# Altium footprint library Connectors.PcbLib: 268 footprints (part 13 of 21)
Each footprint in its own frame and in the unit in brackets; x right, y up, seen from the top. Pads: shape width x height; smd on the part's side, far side on the other; paste and mask are expansions set on the pad; w line width, h text height; cw(c..) or ccw(c..) is an arc to the next point about the centre after c.
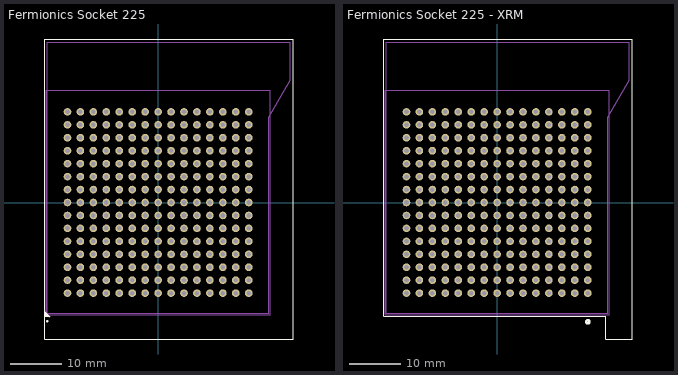
[diagram p12: the footprints below, top view; thin cyan lines are the x and y axes]

## Fermionics Socket 225 [mm] "Fermionics Socket 225"
height 8.636
pads (225):
  round 1.5 hole 0.9: A1(-17.78,-17.78) A2(-15.24,-17.78) A3(-12.7,-17.78) A4(-10.16,-17.78) A5(-7.62,-17.78) A6(-5.08,-17.78) A7(-2.54,-17.78) A8(0,-17.78) A9(2.54,-17.78) A10(5.08,-17.78) A11(7.62,-17.78) A12(10.16,-17.78) A13(12.7,-17.78) A14(15.24,-17.78) A15(17.78,-17.78) B1(-17.78,-15.24) B2(-15.24,-15.24) B3(-12.7,-15.24) B4(-10.16,-15.24) B5(-7.62,-15.24) B6(-5.08,-15.24) B7(-2.54,-15.24) B8(0,-15.24) B9(2.54,-15.24) B10(5.08,-15.24) B11(7.62,-15.24) B12(10.16,-15.24) B13(12.7,-15.24) B14(15.24,-15.24) B15(17.78,-15.24) C1(-17.78,-12.7) C2(-15.24,-12.7) C3(-12.7,-12.7) C4(-10.16,-12.7) C5(-7.62,-12.7) C6(-5.08,-12.7) C7(-2.54,-12.7) C8(0,-12.7) C9(2.54,-12.7) C10(5.08,-12.7) C11(7.62,-12.7) C12(10.16,-12.7) C13(12.7,-12.7) C14(15.24,-12.7) C15(17.78,-12.7) D1(-17.78,-10.16) D2(-15.24,-10.16) D3(-12.7,-10.16) D4(-10.16,-10.16) D5(-7.62,-10.16) D6(-5.08,-10.16) D7(-2.54,-10.16) D8(0,-10.16) D9(2.54,-10.16) D10(5.08,-10.16) D11(7.62,-10.16) D12(10.16,-10.16) D13(12.7,-10.16) D14(15.24,-10.16) D15(17.78,-10.16) E1(-17.78,-7.62) E2(-15.24,-7.62) E3(-12.7,-7.62) E4(-10.16,-7.62) E5(-7.62,-7.62) E6(-5.08,-7.62) E7(-2.54,-7.62) E8(0,-7.62) E9(2.54,-7.62) E10(5.08,-7.62) E11(7.62,-7.62) E12(10.16,-7.62) E13(12.7,-7.62) E14(15.24,-7.62) E15(17.78,-7.62) F1(-17.78,-5.08) F2(-15.24,-5.08) F3(-12.7,-5.08) F4(-10.16,-5.08) F5(-7.62,-5.08) F6(-5.08,-5.08) F7(-2.54,-5.08) F8(0,-5.08) F9(2.54,-5.08) F10(5.08,-5.08) F11(7.62,-5.08) F12(10.16,-5.08) F13(12.7,-5.08) F14(15.24,-5.08) F15(17.78,-5.08) G1(-17.78,-2.54) G2(-15.24,-2.54) G3(-12.7,-2.54) G4(-10.16,-2.54) G5(-7.62,-2.54) G6(-5.08,-2.54) G7(-2.54,-2.54) G8(0,-2.54) G9(2.54,-2.54) G10(5.08,-2.54) G11(7.62,-2.54) G12(10.16,-2.54) G13(12.7,-2.54) G14(15.24,-2.54) G15(17.78,-2.54) H1(-17.78,0) H2(-15.24,0) H3(-12.7,0) H4(-10.16,0) H5(-7.62,0) H6(-5.08,0) H7(-2.54,0) H8(0,0) H9(2.54,0) H10(5.08,0) H11(7.62,0) H12(10.16,0) H13(12.7,0) H14(15.24,0) H15(17.78,0) J1(-17.78,2.54) J2(-15.24,2.54) J3(-12.7,2.54) J4(-10.16,2.54) J5(-7.62,2.54) J6(-5.08,2.54) J7(-2.54,2.54) J8(0,2.54) J9(2.54,2.54) J10(5.08,2.54) J11(7.62,2.54) J12(10.16,2.54) J13(12.7,2.54) J14(15.24,2.54) J15(17.78,2.54) K1(-17.78,5.08) K2(-15.24,5.08) K3(-12.7,5.08) K4(-10.16,5.08) K5(-7.62,5.08) K6(-5.08,5.08) K7(-2.54,5.08) K8(0,5.08) K9(2.54,5.08) K10(5.08,5.08) K11(7.62,5.08) K12(10.16,5.08) K13(12.7,5.08) K14(15.24,5.08) K15(17.78,5.08) L1(-17.78,7.62) L2(-15.24,7.62) L3(-12.7,7.62) L4(-10.16,7.62) L5(-7.62,7.62) L6(-5.08,7.62) L7(-2.54,7.62) L8(0,7.62) L9(2.54,7.62) L10(5.08,7.62) L11(7.62,7.62) L12(10.16,7.62) L13(12.7,7.62) L14(15.24,7.62) L15(17.78,7.62) M1(-17.78,10.16) M2(-15.24,10.16) M3(-12.7,10.16) M4(-10.16,10.16) M5(-7.62,10.16) M6(-5.08,10.16) M7(-2.54,10.16) M8(0,10.16) M9(2.54,10.16) M10(5.08,10.16) M11(7.62,10.16) M12(10.16,10.16) M13(12.7,10.16) M14(15.24,10.16) M15(17.78,10.16) N1(-17.78,12.7) N2(-15.24,12.7) N3(-12.7,12.7) N4(-10.16,12.7) N5(-7.62,12.7) N6(-5.08,12.7) N7(-2.54,12.7) N8(0,12.7) N9(2.54,12.7) N10(5.08,12.7) N11(7.62,12.7) N12(10.16,12.7) N13(12.7,12.7) N14(15.24,12.7) N15(17.78,12.7) P1(-17.78,15.24) P2(-15.24,15.24) P3(-12.7,15.24) P4(-10.16,15.24) P5(-7.62,15.24) P6(-5.08,15.24) P7(-2.54,15.24) P8(0,15.24) P9(2.54,15.24) P10(5.08,15.24) P11(7.62,15.24) P12(10.16,15.24) P13(12.7,15.24) P14(15.24,15.24) P15(17.78,15.24) R1(-17.78,17.78) R2(-15.24,17.78) R3(-12.7,17.78) R4(-10.16,17.78) R5(-7.62,17.78) R6(-5.08,17.78) R7(-2.54,17.78) R8(0,17.78) R9(2.54,17.78) R10(5.08,17.78) R11(7.62,17.78) R12(10.16,17.78) R13(12.7,17.78) R14(15.24,17.78) R15(17.78,17.78)
Top Overlay:
  circle w0.25: c-21.725,-23.275 r0.125
  region: -22.275,-21.45 -21.275,-22.45 -22.275,-22.45
  lines w0.2: -22.275,-21.45 -21.275,-22.45 ; -22.275,-26.775 -22.275,32.075 26.55,32.075 26.55,-26.775 -22.275,-26.775
Mechanical 13:
  lines w0.1: -21.715,-21.715 -21.715,31.485 25.912,31.485 25.912,23.995 21.715,16.755 21.715,-21.715 -21.715,-21.715
Mechanical 15:
  lines w0.05: -21.975,-21.975 -21.975,21.975 21.975,21.975 21.975,-21.975 -21.975,-21.975
3D body: height 8.64, standoff 4, extent 21.975,-26.795 25.726,23.675
3D body: height 8.64, standoff 0, extent -21.715,-21.715 25.912,31.485
3D body: height 0, standoff -3.23, extent -18.075,17.5 -17.5,18.075
3D body: height 0, standoff -3.23, extent -15.535,17.5 -14.96,18.075
3D body: height 0, standoff -3.23, extent -12.995,17.5 -12.42,18.075
3D body: height 0, standoff -3.23, extent -10.455,17.5 -9.88,18.075
3D body: height 0, standoff -3.23, extent -7.915,17.5 -7.34,18.075
3D body: height 0, standoff -3.23, extent -5.375,17.5 -4.8,18.075
3D body: height 0, standoff -3.23, extent -2.835,17.5 -2.26,18.075
3D body: height 0, standoff -3.23, extent -0.295,17.5 0.28,18.075
3D body: height 0, standoff -3.23, extent 2.245,17.5 2.82,18.075
3D body: height 0, standoff -3.23, extent 4.785,17.5 5.36,18.075
3D body: height 0, standoff -3.23, extent 7.325,17.5 7.9,18.075
3D body: height 0, standoff -3.23, extent 9.865,17.5 10.44,18.075
3D body: height 0, standoff -3.23, extent 12.405,17.5 12.98,18.075
3D body: height 0, standoff -3.23, extent 14.945,17.5 15.52,18.075
3D body: height 0, standoff -3.23, extent 17.485,17.5 18.06,18.075
3D body: height 0, standoff -3.23, extent 17.485,14.96 18.06,15.535
3D body: height 0, standoff -3.23, extent 14.945,14.96 15.52,15.535
3D body: height 0, standoff -3.23, extent 12.405,14.96 12.98,15.535
3D body: height 0, standoff -3.23, extent 9.865,14.96 10.44,15.535
3D body: height 0, standoff -3.23, extent 7.325,14.96 7.9,15.535
3D body: height 0, standoff -3.23, extent 4.785,14.96 5.36,15.535
3D body: height 0, standoff -3.23, extent 2.245,14.96 2.82,15.535
3D body: height 0, standoff -3.23, extent -0.295,14.96 0.28,15.535
3D body: height 0, standoff -3.23, extent -2.835,14.96 -2.26,15.535
3D body: height 0, standoff -3.23, extent -5.375,14.96 -4.8,15.535
3D body: height 0, standoff -3.23, extent -7.915,14.96 -7.34,15.535
3D body: height 0, standoff -3.23, extent -10.455,14.96 -9.88,15.535
3D body: height 0, standoff -3.23, extent -12.995,14.96 -12.42,15.535
3D body: height 0, standoff -3.23, extent -15.535,14.96 -14.96,15.535
3D body: height 0, standoff -3.23, extent -18.075,14.96 -17.5,15.535
3D body: height 0, standoff -3.23, extent 17.485,12.42 18.06,12.995
3D body: height 0, standoff -3.23, extent 14.945,12.42 15.52,12.995
3D body: height 0, standoff -3.23, extent 12.405,12.42 12.98,12.995
3D body: height 0, standoff -3.23, extent 9.865,12.42 10.44,12.995
3D body: height 0, standoff -3.23, extent 7.325,12.42 7.9,12.995
3D body: height 0, standoff -3.23, extent 4.785,12.42 5.36,12.995
3D body: height 0, standoff -3.23, extent 2.245,12.42 2.82,12.995
3D body: height 0, standoff -3.23, extent -0.295,12.42 0.28,12.995
3D body: height 0, standoff -3.23, extent -2.835,12.42 -2.26,12.995
3D body: height 0, standoff -3.23, extent -5.375,12.42 -4.8,12.995
3D body: height 0, standoff -3.23, extent -7.915,12.42 -7.34,12.995
3D body: height 0, standoff -3.23, extent -10.455,12.42 -9.88,12.995
3D body: height 0, standoff -3.23, extent -12.995,12.42 -12.42,12.995
3D body: height 0, standoff -3.23, extent -15.535,12.42 -14.96,12.995
3D body: height 0, standoff -3.23, extent -18.075,12.42 -17.5,12.995
3D body: height 0, standoff -3.23, extent 17.485,9.88 18.06,10.455
3D body: height 0, standoff -3.23, extent 14.945,9.88 15.52,10.455
3D body: height 0, standoff -3.23, extent 12.405,9.88 12.98,10.455
3D body: height 0, standoff -3.23, extent 9.865,9.88 10.44,10.455
3D body: height 0, standoff -3.23, extent 7.325,9.88 7.9,10.455
3D body: height 0, standoff -3.23, extent 4.785,9.88 5.36,10.455
3D body: height 0, standoff -3.23, extent 2.245,9.88 2.82,10.455
3D body: height 0, standoff -3.23, extent -0.295,9.88 0.28,10.455
3D body: height 0, standoff -3.23, extent -2.835,9.88 -2.26,10.455
3D body: height 0, standoff -3.23, extent -5.375,9.88 -4.8,10.455
3D body: height 0, standoff -3.23, extent -7.915,9.88 -7.34,10.455
3D body: height 0, standoff -3.23, extent -10.455,9.88 -9.88,10.455
3D body: height 0, standoff -3.23, extent -12.995,9.88 -12.42,10.455
3D body: height 0, standoff -3.23, extent -15.535,9.88 -14.96,10.455
3D body: height 0, standoff -3.23, extent -18.075,9.88 -17.5,10.455
3D body: height 0, standoff -3.23, extent 17.485,7.34 18.06,7.915
3D body: height 0, standoff -3.23, extent 14.945,7.34 15.52,7.915
3D body: height 0, standoff -3.23, extent 12.405,7.34 12.98,7.915
3D body: height 0, standoff -3.23, extent 9.865,7.34 10.44,7.915
3D body: height 0, standoff -3.23, extent 7.325,7.34 7.9,7.915
3D body: height 0, standoff -3.23, extent 4.785,7.34 5.36,7.915
3D body: height 0, standoff -3.23, extent 2.245,7.34 2.82,7.915
3D body: height 0, standoff -3.23, extent -0.295,7.34 0.28,7.915
3D body: height 0, standoff -3.23, extent -2.835,7.34 -2.26,7.915
3D body: height 0, standoff -3.23, extent -5.375,7.34 -4.8,7.915
3D body: height 0, standoff -3.23, extent -7.915,7.34 -7.34,7.915
3D body: height 0, standoff -3.23, extent -10.455,7.34 -9.88,7.915
3D body: height 0, standoff -3.23, extent -12.995,7.34 -12.42,7.915
3D body: height 0, standoff -3.23, extent -15.535,7.34 -14.96,7.915
3D body: height 0, standoff -3.23, extent -18.075,7.34 -17.5,7.915
3D body: height 0, standoff -3.23, extent 17.485,4.8 18.06,5.375
3D body: height 0, standoff -3.23, extent 14.945,4.8 15.52,5.375
3D body: height 0, standoff -3.23, extent 12.405,4.8 12.98,5.375
3D body: height 0, standoff -3.23, extent 9.865,4.8 10.44,5.375
3D body: height 0, standoff -3.23, extent 7.325,4.8 7.9,5.375
3D body: height 0, standoff -3.23, extent 4.785,4.8 5.36,5.375
3D body: height 0, standoff -3.23, extent 2.245,4.8 2.82,5.375
3D body: height 0, standoff -3.23, extent -0.295,4.8 0.28,5.375
3D body: height 0, standoff -3.23, extent -2.835,4.8 -2.26,5.375
3D body: height 0, standoff -3.23, extent -5.375,4.8 -4.8,5.375
3D body: height 0, standoff -3.23, extent -7.915,4.8 -7.34,5.375
3D body: height 0, standoff -3.23, extent -10.455,4.8 -9.88,5.375
3D body: height 0, standoff -3.23, extent -12.995,4.8 -12.42,5.375
3D body: height 0, standoff -3.23, extent -15.535,4.8 -14.96,5.375
3D body: height 0, standoff -3.23, extent -18.075,4.8 -17.5,5.375
3D body: height 0, standoff -3.23, extent 17.485,2.26 18.06,2.835
3D body: height 0, standoff -3.23, extent 14.945,2.26 15.52,2.835
3D body: height 0, standoff -3.23, extent 12.405,2.26 12.98,2.835
3D body: height 0, standoff -3.23, extent 9.865,2.26 10.44,2.835
3D body: height 0, standoff -3.23, extent 7.325,2.26 7.9,2.835
3D body: height 0, standoff -3.23, extent 4.785,2.26 5.36,2.835
3D body: height 0, standoff -3.23, extent 2.245,2.26 2.82,2.835
3D body: height 0, standoff -3.23, extent -0.295,2.26 0.28,2.835
3D body: height 0, standoff -3.23, extent -2.835,2.26 -2.26,2.835
3D body: height 0, standoff -3.23, extent -5.375,2.26 -4.8,2.835
3D body: height 0, standoff -3.23, extent -7.915,2.26 -7.34,2.835
3D body: height 0, standoff -3.23, extent -10.455,2.26 -9.88,2.835
3D body: height 0, standoff -3.23, extent -12.995,2.26 -12.42,2.835
3D body: height 0, standoff -3.23, extent -15.535,2.26 -14.96,2.835
3D body: height 0, standoff -3.23, extent -18.075,2.26 -17.5,2.835
3D body: height 0, standoff -3.23, extent 17.485,-0.28 18.06,0.295
3D body: height 0, standoff -3.23, extent 14.945,-0.28 15.52,0.295
3D body: height 0, standoff -3.23, extent 12.405,-0.28 12.98,0.295
3D body: height 0, standoff -3.23, extent 9.865,-0.28 10.44,0.295
3D body: height 0, standoff -3.23, extent 7.325,-0.28 7.9,0.295
3D body: height 0, standoff -3.23, extent 4.785,-0.28 5.36,0.295
3D body: height 0, standoff -3.23, extent 2.245,-0.28 2.82,0.295
3D body: height 0, standoff -3.23, extent -0.295,-0.28 0.28,0.295
3D body: height 0, standoff -3.23, extent -2.835,-0.28 -2.26,0.295
3D body: height 0, standoff -3.23, extent -5.375,-0.28 -4.8,0.295
3D body: height 0, standoff -3.23, extent -7.915,-0.28 -7.34,0.295
3D body: height 0, standoff -3.23, extent -10.455,-0.28 -9.88,0.295
3D body: height 0, standoff -3.23, extent -12.995,-0.28 -12.42,0.295
3D body: height 0, standoff -3.23, extent -15.535,-0.28 -14.96,0.295
3D body: height 0, standoff -3.23, extent -18.075,-0.28 -17.5,0.295
3D body: height 0, standoff -3.23, extent 17.485,-2.82 18.06,-2.245
3D body: height 0, standoff -3.23, extent 14.945,-2.82 15.52,-2.245
3D body: height 0, standoff -3.23, extent 12.405,-2.82 12.98,-2.245
3D body: height 0, standoff -3.23, extent 9.865,-2.82 10.44,-2.245
3D body: height 0, standoff -3.23, extent 7.325,-2.82 7.9,-2.245
3D body: height 0, standoff -3.23, extent 4.785,-2.82 5.36,-2.245
3D body: height 0, standoff -3.23, extent 2.245,-2.82 2.82,-2.245
3D body: height 0, standoff -3.23, extent -0.295,-2.82 0.28,-2.245
3D body: height 0, standoff -3.23, extent -2.835,-2.82 -2.26,-2.245
3D body: height 0, standoff -3.23, extent -5.375,-2.82 -4.8,-2.245
3D body: height 0, standoff -3.23, extent -7.915,-2.82 -7.34,-2.245
3D body: height 0, standoff -3.23, extent -10.455,-2.82 -9.88,-2.245
3D body: height 0, standoff -3.23, extent -12.995,-2.82 -12.42,-2.245
3D body: height 0, standoff -3.23, extent -15.535,-2.82 -14.96,-2.245
3D body: height 0, standoff -3.23, extent -18.075,-2.82 -17.5,-2.245
3D body: height 0, standoff -3.23, extent 17.485,-5.36 18.06,-4.785
3D body: height 0, standoff -3.23, extent 14.945,-5.36 15.52,-4.785
3D body: height 0, standoff -3.23, extent 12.405,-5.36 12.98,-4.785
3D body: height 0, standoff -3.23, extent 9.865,-5.36 10.44,-4.785
3D body: height 0, standoff -3.23, extent 7.325,-5.36 7.9,-4.785
3D body: height 0, standoff -3.23, extent 4.785,-5.36 5.36,-4.785
3D body: height 0, standoff -3.23, extent 2.245,-5.36 2.82,-4.785
3D body: height 0, standoff -3.23, extent -0.295,-5.36 0.28,-4.785
3D body: height 0, standoff -3.23, extent -2.835,-5.36 -2.26,-4.785
3D body: height 0, standoff -3.23, extent -5.375,-5.36 -4.8,-4.785
3D body: height 0, standoff -3.23, extent -7.915,-5.36 -7.34,-4.785
3D body: height 0, standoff -3.23, extent -10.455,-5.36 -9.88,-4.785
3D body: height 0, standoff -3.23, extent -12.995,-5.36 -12.42,-4.785
3D body: height 0, standoff -3.23, extent -15.535,-5.36 -14.96,-4.785
3D body: height 0, standoff -3.23, extent -18.075,-5.36 -17.5,-4.785
3D body: height 0, standoff -3.23, extent 17.485,-7.9 18.06,-7.325
3D body: height 0, standoff -3.23, extent 14.945,-7.9 15.52,-7.325
3D body: height 0, standoff -3.23, extent 12.405,-7.9 12.98,-7.325
3D body: height 0, standoff -3.23, extent 9.865,-7.9 10.44,-7.325
3D body: height 0, standoff -3.23, extent 7.325,-7.9 7.9,-7.325
3D body: height 0, standoff -3.23, extent 4.785,-7.9 5.36,-7.325
3D body: height 0, standoff -3.23, extent 2.245,-7.9 2.82,-7.325
3D body: height 0, standoff -3.23, extent -0.295,-7.9 0.28,-7.325
3D body: height 0, standoff -3.23, extent -2.835,-7.9 -2.26,-7.325
3D body: height 0, standoff -3.23, extent -5.375,-7.9 -4.8,-7.325
3D body: height 0, standoff -3.23, extent -7.915,-7.9 -7.34,-7.325
3D body: height 0, standoff -3.23, extent -10.455,-7.9 -9.88,-7.325
3D body: height 0, standoff -3.23, extent -12.995,-7.9 -12.42,-7.325
3D body: height 0, standoff -3.23, extent -15.535,-7.9 -14.96,-7.325
3D body: height 0, standoff -3.23, extent -18.075,-7.9 -17.5,-7.325
3D body: height 0, standoff -3.23, extent 17.485,-10.44 18.06,-9.865
3D body: height 0, standoff -3.23, extent 14.945,-10.44 15.52,-9.865
3D body: height 0, standoff -3.23, extent 12.405,-10.44 12.98,-9.865
3D body: height 0, standoff -3.23, extent 9.865,-10.44 10.44,-9.865
3D body: height 0, standoff -3.23, extent 7.325,-10.44 7.9,-9.865
3D body: height 0, standoff -3.23, extent 4.785,-10.44 5.36,-9.865
3D body: height 0, standoff -3.23, extent 2.245,-10.44 2.82,-9.865
3D body: height 0, standoff -3.23, extent -0.295,-10.44 0.28,-9.865
3D body: height 0, standoff -3.23, extent -2.835,-10.44 -2.26,-9.865
3D body: height 0, standoff -3.23, extent -5.375,-10.44 -4.8,-9.865
3D body: height 0, standoff -3.23, extent -7.915,-10.44 -7.34,-9.865
3D body: height 0, standoff -3.23, extent -10.455,-10.44 -9.88,-9.865
3D body: height 0, standoff -3.23, extent -12.995,-10.44 -12.42,-9.865
3D body: height 0, standoff -3.23, extent -15.535,-10.44 -14.96,-9.865
3D body: height 0, standoff -3.23, extent -18.075,-10.44 -17.5,-9.865
3D body: height 0, standoff -3.23, extent 17.485,-12.98 18.06,-12.405
3D body: height 0, standoff -3.23, extent 14.945,-12.98 15.52,-12.405
3D body: height 0, standoff -3.23, extent 12.405,-12.98 12.98,-12.405
3D body: height 0, standoff -3.23, extent 9.865,-12.98 10.44,-12.405
3D body: height 0, standoff -3.23, extent 7.325,-12.98 7.9,-12.405
3D body: height 0, standoff -3.23, extent 4.785,-12.98 5.36,-12.405
3D body: height 0, standoff -3.23, extent 2.245,-12.98 2.82,-12.405
3D body: height 0, standoff -3.23, extent -0.295,-12.98 0.28,-12.405
3D body: height 0, standoff -3.23, extent -2.835,-12.98 -2.26,-12.405
3D body: height 0, standoff -3.23, extent -5.375,-12.98 -4.8,-12.405
3D body: height 0, standoff -3.23, extent -7.915,-12.98 -7.34,-12.405
3D body: height 0, standoff -3.23, extent -10.455,-12.98 -9.88,-12.405
3D body: height 0, standoff -3.23, extent -12.995,-12.98 -12.42,-12.405
3D body: height 0, standoff -3.23, extent -15.535,-12.98 -14.96,-12.405
3D body: height 0, standoff -3.23, extent -18.075,-12.98 -17.5,-12.405
3D body: height 0, standoff -3.23, extent 17.485,-15.52 18.06,-14.945
3D body: height 0, standoff -3.23, extent 14.945,-15.52 15.52,-14.945
3D body: height 0, standoff -3.23, extent 12.405,-15.52 12.98,-14.945
3D body: height 0, standoff -3.23, extent 9.865,-15.52 10.44,-14.945
3D body: height 0, standoff -3.23, extent 7.325,-15.52 7.9,-14.945
3D body: height 0, standoff -3.23, extent 4.785,-15.52 5.36,-14.945
3D body: height 0, standoff -3.23, extent 2.245,-15.52 2.82,-14.945
3D body: height 0, standoff -3.23, extent -0.295,-15.52 0.28,-14.945
3D body: height 0, standoff -3.23, extent -2.835,-15.52 -2.26,-14.945
3D body: height 0, standoff -3.23, extent -5.375,-15.52 -4.8,-14.945
3D body: height 0, standoff -3.23, extent -7.915,-15.52 -7.34,-14.945
3D body: height 0, standoff -3.23, extent -10.455,-15.52 -9.88,-14.945
3D body: height 0, standoff -3.23, extent -12.995,-15.52 -12.42,-14.945
3D body: height 0, standoff -3.23, extent -15.535,-15.52 -14.96,-14.945
3D body: height 0, standoff -3.23, extent -18.075,-15.52 -17.5,-14.945
3D body: height 0, standoff -3.23, extent 17.485,-18.06 18.06,-17.485
3D body: height 0, standoff -3.23, extent 14.945,-18.06 15.52,-17.485
3D body: height 0, standoff -3.23, extent 12.405,-18.06 12.98,-17.485
3D body: height 0, standoff -3.23, extent 9.865,-18.06 10.44,-17.485
3D body: height 0, standoff -3.23, extent 7.325,-18.06 7.9,-17.485
3D body: height 0, standoff -3.23, extent 4.785,-18.06 5.36,-17.485
3D body: height 0, standoff -3.23, extent 2.245,-18.06 2.82,-17.485
3D body: height 0, standoff -3.23, extent -0.295,-18.06 0.28,-17.485
3D body: height 0, standoff -3.23, extent -2.835,-18.06 -2.26,-17.485
3D body: height 0, standoff -3.23, extent -5.375,-18.06 -4.8,-17.485
3D body: height 0, standoff -3.23, extent -7.915,-18.06 -7.34,-17.485
3D body: height 0, standoff -3.23, extent -10.455,-18.06 -9.88,-17.485
3D body: height 0, standoff -3.23, extent -12.995,-18.06 -12.42,-17.485
3D body: height 0, standoff -3.23, extent -15.535,-18.06 -14.96,-17.485
3D body: height 0, standoff -3.23, extent -18.075,-18.06 -17.5,-17.485

## Fermionics Socket 225 - XRM [mm] "Fermionics Socket 225 - Rotated Pinout to match Sensor"
height 8.636
pads (225):
  round 1.5 hole 0.9: A1(17.78,-17.78) A2(15.24,-17.78) A3(12.7,-17.78) A4(10.16,-17.78) A5(7.62,-17.78) A6(5.08,-17.78) A7(2.54,-17.78) A8(0,-17.78) A9(-2.54,-17.78) A10(-5.08,-17.78) A11(-7.62,-17.78) A12(-10.16,-17.78) A13(-12.7,-17.78) A14(-15.24,-17.78) A15(-17.78,-17.78) B1(17.78,-15.24) B2(15.24,-15.24) B3(12.7,-15.24) B4(10.16,-15.24) B5(7.62,-15.24) B6(5.08,-15.24) B7(2.54,-15.24) B8(0,-15.24) B9(-2.54,-15.24) B10(-5.08,-15.24) B11(-7.62,-15.24) B12(-10.16,-15.24) B13(-12.7,-15.24) B14(-15.24,-15.24) B15(-17.78,-15.24) C1(17.78,-12.7) C2(15.24,-12.7) C3(12.7,-12.7) C4(10.16,-12.7) C5(7.62,-12.7) C6(5.08,-12.7) C7(2.54,-12.7) C8(0,-12.7) C9(-2.54,-12.7) C10(-5.08,-12.7) C11(-7.62,-12.7) C12(-10.16,-12.7) C13(-12.7,-12.7) C14(-15.24,-12.7) C15(-17.78,-12.7) D1(17.78,-10.16) D2(15.24,-10.16) D3(12.7,-10.16) D4(10.16,-10.16) D5(7.62,-10.16) D6(5.08,-10.16) D7(2.54,-10.16) D8(0,-10.16) D9(-2.54,-10.16) D10(-5.08,-10.16) D11(-7.62,-10.16) D12(-10.16,-10.16) D13(-12.7,-10.16) D14(-15.24,-10.16) D15(-17.78,-10.16) E1(17.78,-7.62) E2(15.24,-7.62) E3(12.7,-7.62) E4(10.16,-7.62) E5(7.62,-7.62) E6(5.08,-7.62) E7(2.54,-7.62) E8(0,-7.62) E9(-2.54,-7.62) E10(-5.08,-7.62) E11(-7.62,-7.62) E12(-10.16,-7.62) E13(-12.7,-7.62) E14(-15.24,-7.62) E15(-17.78,-7.62) F1(17.78,-5.08) F2(15.24,-5.08) F3(12.7,-5.08) F4(10.16,-5.08) F5(7.62,-5.08) F6(5.08,-5.08) F7(2.54,-5.08) F8(0,-5.08) F9(-2.54,-5.08) F10(-5.08,-5.08) F11(-7.62,-5.08) F12(-10.16,-5.08) F13(-12.7,-5.08) F14(-15.24,-5.08) F15(-17.78,-5.08) G1(17.78,-2.54) G2(15.24,-2.54) G3(12.7,-2.54) G4(10.16,-2.54) G5(7.62,-2.54) G6(5.08,-2.54) G7(2.54,-2.54) G8(0,-2.54) G9(-2.54,-2.54) G10(-5.08,-2.54) G11(-7.62,-2.54) G12(-10.16,-2.54) G13(-12.7,-2.54) G14(-15.24,-2.54) G15(-17.78,-2.54) H1(17.78,0) H2(15.24,0) H3(12.7,0) H4(10.16,0) H5(7.62,0) H6(5.08,0) H7(2.54,0) H8(0,0) H9(-2.54,0) H10(-5.08,0) H11(-7.62,0) H12(-10.16,0) H13(-12.7,0) H14(-15.24,0) H15(-17.78,0) J1(17.78,2.54) J2(15.24,2.54) J3(12.7,2.54) J4(10.16,2.54) J5(7.62,2.54) J6(5.08,2.54) J7(2.54,2.54) J8(0,2.54) J9(-2.54,2.54) J10(-5.08,2.54) J11(-7.62,2.54) J12(-10.16,2.54) J13(-12.7,2.54) J14(-15.24,2.54) J15(-17.78,2.54) K1(17.78,5.08) K2(15.24,5.08) K3(12.7,5.08) K4(10.16,5.08) K5(7.62,5.08) K6(5.08,5.08) K7(2.54,5.08) K8(0,5.08) K9(-2.54,5.08) K10(-5.08,5.08) K11(-7.62,5.08) K12(-10.16,5.08) K13(-12.7,5.08) K14(-15.24,5.08) K15(-17.78,5.08) L1(17.78,7.62) L2(15.24,7.62) L3(12.7,7.62) L4(10.16,7.62) L5(7.62,7.62) L6(5.08,7.62) L7(2.54,7.62) L8(0,7.62) L9(-2.54,7.62) L10(-5.08,7.62) L11(-7.62,7.62) L12(-10.16,7.62) L13(-12.7,7.62) L14(-15.24,7.62) L15(-17.78,7.62) M1(17.78,10.16) M2(15.24,10.16) M3(12.7,10.16) M4(10.16,10.16) M5(7.62,10.16) M6(5.08,10.16) M7(2.54,10.16) M8(0,10.16) M9(-2.54,10.16) M10(-5.08,10.16) M11(-7.62,10.16) M12(-10.16,10.16) M13(-12.7,10.16) M14(-15.24,10.16) M15(-17.78,10.16) N1(17.78,12.7) N2(15.24,12.7) N3(12.7,12.7) N4(10.16,12.7) N5(7.62,12.7) N6(5.08,12.7) N7(2.54,12.7) N8(0,12.7) N9(-2.54,12.7) N10(-5.08,12.7) N11(-7.62,12.7) N12(-10.16,12.7) N13(-12.7,12.7) N14(-15.24,12.7) N15(-17.78,12.7) P1(17.78,15.24) P2(15.24,15.24) P3(12.7,15.24) P4(10.16,15.24) P5(7.62,15.24) P6(5.08,15.24) P7(2.54,15.24) P8(0,15.24) P9(-2.54,15.24) P10(-5.08,15.24) P11(-7.62,15.24) P12(-10.16,15.24) P13(-12.7,15.24) P14(-15.24,15.24) P15(-17.78,15.24) R1(17.78,17.78) R2(15.24,17.78) R3(12.7,17.78) R4(10.16,17.78) R5(7.62,17.78) R6(5.08,17.78) R7(2.54,17.78) R8(0,17.78) R9(-2.54,17.78) R10(-5.08,17.78) R11(-7.62,17.78) R12(-10.16,17.78) R13(-12.7,17.78) R14(-15.24,17.78) R15(-17.78,17.78)
Top Overlay:
  circle w0.5: c17.8,-23.4 r0.3
  lines w0.2: -22.275,-22.3 -22.275,32.075 26.55,32.075 26.55,-26.775 21.35,-26.775 21.35,-22.3 -22.275,-22.3
Mechanical 13:
  lines w0.1: -21.715,-21.715 -21.715,31.485 25.912,31.485 25.912,23.995 21.715,16.755 21.715,-21.715 -21.715,-21.715
Mechanical 15:
  lines w0.05: -21.975,-21.975 -21.975,21.975 21.975,21.975 21.975,-21.975 -21.975,-21.975
3D body: height 8.64, standoff 4, extent 21.975,-26.795 25.726,23.675
3D body: height 8.64, standoff 0, extent -21.715,-21.715 25.912,31.485
3D body: height 0, standoff -3.23, extent -18.075,-18.075 -17.5,-17.5
3D body: height 0, standoff -3.23, extent -18.075,-15.535 -17.5,-14.96
3D body: height 0, standoff -3.23, extent -18.075,-12.995 -17.5,-12.42
3D body: height 0, standoff -3.23, extent -18.075,-10.455 -17.5,-9.88
3D body: height 0, standoff -3.23, extent -18.075,-7.915 -17.5,-7.34
3D body: height 0, standoff -3.23, extent -18.075,-5.375 -17.5,-4.8
3D body: height 0, standoff -3.23, extent -18.075,-2.835 -17.5,-2.26
3D body: height 0, standoff -3.23, extent -18.075,-0.295 -17.5,0.28
3D body: height 0, standoff -3.23, extent -18.075,2.245 -17.5,2.82
3D body: height 0, standoff -3.23, extent -18.075,4.785 -17.5,5.36
3D body: height 0, standoff -3.23, extent -18.075,7.325 -17.5,7.9
3D body: height 0, standoff -3.23, extent -18.075,9.865 -17.5,10.44
3D body: height 0, standoff -3.23, extent -18.075,12.405 -17.5,12.98
3D body: height 0, standoff -3.23, extent -18.075,14.945 -17.5,15.52
3D body: height 0, standoff -3.23, extent -18.075,17.485 -17.5,18.06
3D body: height 0, standoff -3.23, extent -15.535,17.485 -14.96,18.06
3D body: height 0, standoff -3.23, extent -15.535,14.945 -14.96,15.52
3D body: height 0, standoff -3.23, extent -15.535,12.405 -14.96,12.98
3D body: height 0, standoff -3.23, extent -15.535,9.865 -14.96,10.44
3D body: height 0, standoff -3.23, extent -15.535,7.325 -14.96,7.9
3D body: height 0, standoff -3.23, extent -15.535,4.785 -14.96,5.36
3D body: height 0, standoff -3.23, extent -15.535,2.245 -14.96,2.82
3D body: height 0, standoff -3.23, extent -15.535,-0.295 -14.96,0.28
3D body: height 0, standoff -3.23, extent -15.535,-2.835 -14.96,-2.26
3D body: height 0, standoff -3.23, extent -15.535,-5.375 -14.96,-4.8
3D body: height 0, standoff -3.23, extent -15.535,-7.915 -14.96,-7.34
3D body: height 0, standoff -3.23, extent -15.535,-10.455 -14.96,-9.88
3D body: height 0, standoff -3.23, extent -15.535,-12.995 -14.96,-12.42
3D body: height 0, standoff -3.23, extent -15.535,-15.535 -14.96,-14.96
3D body: height 0, standoff -3.23, extent -15.535,-18.075 -14.96,-17.5
3D body: height 0, standoff -3.23, extent -12.995,17.485 -12.42,18.06
3D body: height 0, standoff -3.23, extent -12.995,14.945 -12.42,15.52
3D body: height 0, standoff -3.23, extent -12.995,12.405 -12.42,12.98
3D body: height 0, standoff -3.23, extent -12.995,9.865 -12.42,10.44
3D body: height 0, standoff -3.23, extent -12.995,7.325 -12.42,7.9
3D body: height 0, standoff -3.23, extent -12.995,4.785 -12.42,5.36
3D body: height 0, standoff -3.23, extent -12.995,2.245 -12.42,2.82
3D body: height 0, standoff -3.23, extent -12.995,-0.295 -12.42,0.28
3D body: height 0, standoff -3.23, extent -12.995,-2.835 -12.42,-2.26
3D body: height 0, standoff -3.23, extent -12.995,-5.375 -12.42,-4.8
3D body: height 0, standoff -3.23, extent -12.995,-7.915 -12.42,-7.34
3D body: height 0, standoff -3.23, extent -12.995,-10.455 -12.42,-9.88
3D body: height 0, standoff -3.23, extent -12.995,-12.995 -12.42,-12.42
3D body: height 0, standoff -3.23, extent -12.995,-15.535 -12.42,-14.96
3D body: height 0, standoff -3.23, extent -12.995,-18.075 -12.42,-17.5
3D body: height 0, standoff -3.23, extent -10.455,17.485 -9.88,18.06
3D body: height 0, standoff -3.23, extent -10.455,14.945 -9.88,15.52
3D body: height 0, standoff -3.23, extent -10.455,12.405 -9.88,12.98
3D body: height 0, standoff -3.23, extent -10.455,9.865 -9.88,10.44
3D body: height 0, standoff -3.23, extent -10.455,7.325 -9.88,7.9
3D body: height 0, standoff -3.23, extent -10.455,4.785 -9.88,5.36
3D body: height 0, standoff -3.23, extent -10.455,2.245 -9.88,2.82
3D body: height 0, standoff -3.23, extent -10.455,-0.295 -9.88,0.28
3D body: height 0, standoff -3.23, extent -10.455,-2.835 -9.88,-2.26
3D body: height 0, standoff -3.23, extent -10.455,-5.375 -9.88,-4.8
3D body: height 0, standoff -3.23, extent -10.455,-7.915 -9.88,-7.34
3D body: height 0, standoff -3.23, extent -10.455,-10.455 -9.88,-9.88
3D body: height 0, standoff -3.23, extent -10.455,-12.995 -9.88,-12.42
3D body: height 0, standoff -3.23, extent -10.455,-15.535 -9.88,-14.96
3D body: height 0, standoff -3.23, extent -10.455,-18.075 -9.88,-17.5
3D body: height 0, standoff -3.23, extent -7.915,17.485 -7.34,18.06
3D body: height 0, standoff -3.23, extent -7.915,14.945 -7.34,15.52
3D body: height 0, standoff -3.23, extent -7.915,12.405 -7.34,12.98
3D body: height 0, standoff -3.23, extent -7.915,9.865 -7.34,10.44
3D body: height 0, standoff -3.23, extent -7.915,7.325 -7.34,7.9
3D body: height 0, standoff -3.23, extent -7.915,4.785 -7.34,5.36
3D body: height 0, standoff -3.23, extent -7.915,2.245 -7.34,2.82
3D body: height 0, standoff -3.23, extent -7.915,-0.295 -7.34,0.28
3D body: height 0, standoff -3.23, extent -7.915,-2.835 -7.34,-2.26
3D body: height 0, standoff -3.23, extent -7.915,-5.375 -7.34,-4.8
3D body: height 0, standoff -3.23, extent -7.915,-7.915 -7.34,-7.34
3D body: height 0, standoff -3.23, extent -7.915,-10.455 -7.34,-9.88
3D body: height 0, standoff -3.23, extent -7.915,-12.995 -7.34,-12.42
3D body: height 0, standoff -3.23, extent -7.915,-15.535 -7.34,-14.96
3D body: height 0, standoff -3.23, extent -7.915,-18.075 -7.34,-17.5
3D body: height 0, standoff -3.23, extent -5.375,17.485 -4.8,18.06
3D body: height 0, standoff -3.23, extent -5.375,14.945 -4.8,15.52
3D body: height 0, standoff -3.23, extent -5.375,12.405 -4.8,12.98
3D body: height 0, standoff -3.23, extent -5.375,9.865 -4.8,10.44
3D body: height 0, standoff -3.23, extent -5.375,7.325 -4.8,7.9
3D body: height 0, standoff -3.23, extent -5.375,4.785 -4.8,5.36
3D body: height 0, standoff -3.23, extent -5.375,2.245 -4.8,2.82
3D body: height 0, standoff -3.23, extent -5.375,-0.295 -4.8,0.28
3D body: height 0, standoff -3.23, extent -5.375,-2.835 -4.8,-2.26
3D body: height 0, standoff -3.23, extent -5.375,-5.375 -4.8,-4.8
3D body: height 0, standoff -3.23, extent -5.375,-7.915 -4.8,-7.34
3D body: height 0, standoff -3.23, extent -5.375,-10.455 -4.8,-9.88
3D body: height 0, standoff -3.23, extent -5.375,-12.995 -4.8,-12.42
3D body: height 0, standoff -3.23, extent -5.375,-15.535 -4.8,-14.96
3D body: height 0, standoff -3.23, extent -5.375,-18.075 -4.8,-17.5
3D body: height 0, standoff -3.23, extent -2.835,17.485 -2.26,18.06
3D body: height 0, standoff -3.23, extent -2.835,14.945 -2.26,15.52
3D body: height 0, standoff -3.23, extent -2.835,12.405 -2.26,12.98
3D body: height 0, standoff -3.23, extent -2.835,9.865 -2.26,10.44
3D body: height 0, standoff -3.23, extent -2.835,7.325 -2.26,7.9
3D body: height 0, standoff -3.23, extent -2.835,4.785 -2.26,5.36
3D body: height 0, standoff -3.23, extent -2.835,2.245 -2.26,2.82
3D body: height 0, standoff -3.23, extent -2.835,-0.295 -2.26,0.28
3D body: height 0, standoff -3.23, extent -2.835,-2.835 -2.26,-2.26
3D body: height 0, standoff -3.23, extent -2.835,-5.375 -2.26,-4.8
3D body: height 0, standoff -3.23, extent -2.835,-7.915 -2.26,-7.34
3D body: height 0, standoff -3.23, extent -2.835,-10.455 -2.26,-9.88
3D body: height 0, standoff -3.23, extent -2.835,-12.995 -2.26,-12.42
3D body: height 0, standoff -3.23, extent -2.835,-15.535 -2.26,-14.96
3D body: height 0, standoff -3.23, extent -2.835,-18.075 -2.26,-17.5
3D body: height 0, standoff -3.23, extent -0.295,17.485 0.28,18.06
3D body: height 0, standoff -3.23, extent -0.295,14.945 0.28,15.52
3D body: height 0, standoff -3.23, extent -0.295,12.405 0.28,12.98
3D body: height 0, standoff -3.23, extent -0.295,9.865 0.28,10.44
3D body: height 0, standoff -3.23, extent -0.295,7.325 0.28,7.9
3D body: height 0, standoff -3.23, extent -0.295,4.785 0.28,5.36
3D body: height 0, standoff -3.23, extent -0.295,2.245 0.28,2.82
3D body: height 0, standoff -3.23, extent -0.295,-0.295 0.28,0.28
3D body: height 0, standoff -3.23, extent -0.295,-2.835 0.28,-2.26
3D body: height 0, standoff -3.23, extent -0.295,-5.375 0.28,-4.8
3D body: height 0, standoff -3.23, extent -0.295,-7.915 0.28,-7.34
3D body: height 0, standoff -3.23, extent -0.295,-10.455 0.28,-9.88
3D body: height 0, standoff -3.23, extent -0.295,-12.995 0.28,-12.42
3D body: height 0, standoff -3.23, extent -0.295,-15.535 0.28,-14.96
3D body: height 0, standoff -3.23, extent -0.295,-18.075 0.28,-17.5
3D body: height 0, standoff -3.23, extent 2.245,17.485 2.82,18.06
3D body: height 0, standoff -3.23, extent 2.245,14.945 2.82,15.52
3D body: height 0, standoff -3.23, extent 2.245,12.405 2.82,12.98
3D body: height 0, standoff -3.23, extent 2.245,9.865 2.82,10.44
3D body: height 0, standoff -3.23, extent 2.245,7.325 2.82,7.9
3D body: height 0, standoff -3.23, extent 2.245,4.785 2.82,5.36
3D body: height 0, standoff -3.23, extent 2.245,2.245 2.82,2.82
3D body: height 0, standoff -3.23, extent 2.245,-0.295 2.82,0.28
3D body: height 0, standoff -3.23, extent 2.245,-2.835 2.82,-2.26
3D body: height 0, standoff -3.23, extent 2.245,-5.375 2.82,-4.8
3D body: height 0, standoff -3.23, extent 2.245,-7.915 2.82,-7.34
3D body: height 0, standoff -3.23, extent 2.245,-10.455 2.82,-9.88
3D body: height 0, standoff -3.23, extent 2.245,-12.995 2.82,-12.42
3D body: height 0, standoff -3.23, extent 2.245,-15.535 2.82,-14.96
3D body: height 0, standoff -3.23, extent 2.245,-18.075 2.82,-17.5
3D body: height 0, standoff -3.23, extent 4.785,17.485 5.36,18.06
3D body: height 0, standoff -3.23, extent 4.785,14.945 5.36,15.52
3D body: height 0, standoff -3.23, extent 4.785,12.405 5.36,12.98
3D body: height 0, standoff -3.23, extent 4.785,9.865 5.36,10.44
3D body: height 0, standoff -3.23, extent 4.785,7.325 5.36,7.9
3D body: height 0, standoff -3.23, extent 4.785,4.785 5.36,5.36
3D body: height 0, standoff -3.23, extent 4.785,2.245 5.36,2.82
3D body: height 0, standoff -3.23, extent 4.785,-0.295 5.36,0.28
3D body: height 0, standoff -3.23, extent 4.785,-2.835 5.36,-2.26
3D body: height 0, standoff -3.23, extent 4.785,-5.375 5.36,-4.8
3D body: height 0, standoff -3.23, extent 4.785,-7.915 5.36,-7.34
3D body: height 0, standoff -3.23, extent 4.785,-10.455 5.36,-9.88
3D body: height 0, standoff -3.23, extent 4.785,-12.995 5.36,-12.42
3D body: height 0, standoff -3.23, extent 4.785,-15.535 5.36,-14.96
3D body: height 0, standoff -3.23, extent 4.785,-18.075 5.36,-17.5
3D body: height 0, standoff -3.23, extent 7.325,17.485 7.9,18.06
3D body: height 0, standoff -3.23, extent 7.325,14.945 7.9,15.52
3D body: height 0, standoff -3.23, extent 7.325,12.405 7.9,12.98
3D body: height 0, standoff -3.23, extent 7.325,9.865 7.9,10.44
3D body: height 0, standoff -3.23, extent 7.325,7.325 7.9,7.9
3D body: height 0, standoff -3.23, extent 7.325,4.785 7.9,5.36
3D body: height 0, standoff -3.23, extent 7.325,2.245 7.9,2.82
3D body: height 0, standoff -3.23, extent 7.325,-0.295 7.9,0.28
3D body: height 0, standoff -3.23, extent 7.325,-2.835 7.9,-2.26
3D body: height 0, standoff -3.23, extent 7.325,-5.375 7.9,-4.8
3D body: height 0, standoff -3.23, extent 7.325,-7.915 7.9,-7.34
3D body: height 0, standoff -3.23, extent 7.325,-10.455 7.9,-9.88
3D body: height 0, standoff -3.23, extent 7.325,-12.995 7.9,-12.42
3D body: height 0, standoff -3.23, extent 7.325,-15.535 7.9,-14.96
3D body: height 0, standoff -3.23, extent 7.325,-18.075 7.9,-17.5
3D body: height 0, standoff -3.23, extent 9.865,17.485 10.44,18.06
3D body: height 0, standoff -3.23, extent 9.865,14.945 10.44,15.52
3D body: height 0, standoff -3.23, extent 9.865,12.405 10.44,12.98
3D body: height 0, standoff -3.23, extent 9.865,9.865 10.44,10.44
3D body: height 0, standoff -3.23, extent 9.865,7.325 10.44,7.9
3D body: height 0, standoff -3.23, extent 9.865,4.785 10.44,5.36
3D body: height 0, standoff -3.23, extent 9.865,2.245 10.44,2.82
3D body: height 0, standoff -3.23, extent 9.865,-0.295 10.44,0.28
3D body: height 0, standoff -3.23, extent 9.865,-2.835 10.44,-2.26
3D body: height 0, standoff -3.23, extent 9.865,-5.375 10.44,-4.8
3D body: height 0, standoff -3.23, extent 9.865,-7.915 10.44,-7.34
3D body: height 0, standoff -3.23, extent 9.865,-10.455 10.44,-9.88
3D body: height 0, standoff -3.23, extent 9.865,-12.995 10.44,-12.42
3D body: height 0, standoff -3.23, extent 9.865,-15.535 10.44,-14.96
3D body: height 0, standoff -3.23, extent 9.865,-18.075 10.44,-17.5
3D body: height 0, standoff -3.23, extent 12.405,17.485 12.98,18.06
3D body: height 0, standoff -3.23, extent 12.405,14.945 12.98,15.52
3D body: height 0, standoff -3.23, extent 12.405,12.405 12.98,12.98
3D body: height 0, standoff -3.23, extent 12.405,9.865 12.98,10.44
3D body: height 0, standoff -3.23, extent 12.405,7.325 12.98,7.9
3D body: height 0, standoff -3.23, extent 12.405,4.785 12.98,5.36
3D body: height 0, standoff -3.23, extent 12.405,2.245 12.98,2.82
3D body: height 0, standoff -3.23, extent 12.405,-0.295 12.98,0.28
3D body: height 0, standoff -3.23, extent 12.405,-2.835 12.98,-2.26
3D body: height 0, standoff -3.23, extent 12.405,-5.375 12.98,-4.8
3D body: height 0, standoff -3.23, extent 12.405,-7.915 12.98,-7.34
3D body: height 0, standoff -3.23, extent 12.405,-10.455 12.98,-9.88
3D body: height 0, standoff -3.23, extent 12.405,-12.995 12.98,-12.42
3D body: height 0, standoff -3.23, extent 12.405,-15.535 12.98,-14.96
3D body: height 0, standoff -3.23, extent 12.405,-18.075 12.98,-17.5
3D body: height 0, standoff -3.23, extent 14.945,17.485 15.52,18.06
3D body: height 0, standoff -3.23, extent 14.945,14.945 15.52,15.52
3D body: height 0, standoff -3.23, extent 14.945,12.405 15.52,12.98
3D body: height 0, standoff -3.23, extent 14.945,9.865 15.52,10.44
3D body: height 0, standoff -3.23, extent 14.945,7.325 15.52,7.9
3D body: height 0, standoff -3.23, extent 14.945,4.785 15.52,5.36
3D body: height 0, standoff -3.23, extent 14.945,2.245 15.52,2.82
3D body: height 0, standoff -3.23, extent 14.945,-0.295 15.52,0.28
3D body: height 0, standoff -3.23, extent 14.945,-2.835 15.52,-2.26
3D body: height 0, standoff -3.23, extent 14.945,-5.375 15.52,-4.8
3D body: height 0, standoff -3.23, extent 14.945,-7.915 15.52,-7.34
3D body: height 0, standoff -3.23, extent 14.945,-10.455 15.52,-9.88
3D body: height 0, standoff -3.23, extent 14.945,-12.995 15.52,-12.42
3D body: height 0, standoff -3.23, extent 14.945,-15.535 15.52,-14.96
3D body: height 0, standoff -3.23, extent 14.945,-18.075 15.52,-17.5
3D body: height 0, standoff -3.23, extent 17.485,17.485 18.06,18.06
3D body: height 0, standoff -3.23, extent 17.485,14.945 18.06,15.52
3D body: height 0, standoff -3.23, extent 17.485,12.405 18.06,12.98
3D body: height 0, standoff -3.23, extent 17.485,9.865 18.06,10.44
3D body: height 0, standoff -3.23, extent 17.485,7.325 18.06,7.9
3D body: height 0, standoff -3.23, extent 17.485,4.785 18.06,5.36
3D body: height 0, standoff -3.23, extent 17.485,2.245 18.06,2.82
3D body: height 0, standoff -3.23, extent 17.485,-0.295 18.06,0.28
3D body: height 0, standoff -3.23, extent 17.485,-2.835 18.06,-2.26
3D body: height 0, standoff -3.23, extent 17.485,-5.375 18.06,-4.8
3D body: height 0, standoff -3.23, extent 17.485,-7.915 18.06,-7.34
3D body: height 0, standoff -3.23, extent 17.485,-10.455 18.06,-9.88
3D body: height 0, standoff -3.23, extent 17.485,-12.995 18.06,-12.42
3D body: height 0, standoff -3.23, extent 17.485,-15.535 18.06,-14.96
3D body: height 0, standoff -3.23, extent 17.485,-18.075 18.06,-17.5